# Altium footprint library DC_Motor.PcbLib: 32 footprints (part 2 of 2)
Each footprint in its own frame and in the unit in brackets; x right, y up, seen from the top. Pads: shape width x height; smd on the part's side, far side on the other; paste and mask are expansions set on the pad; w line width, h text height; cw(c..) or ccw(c..) is an arc to the next point about the centre after c.
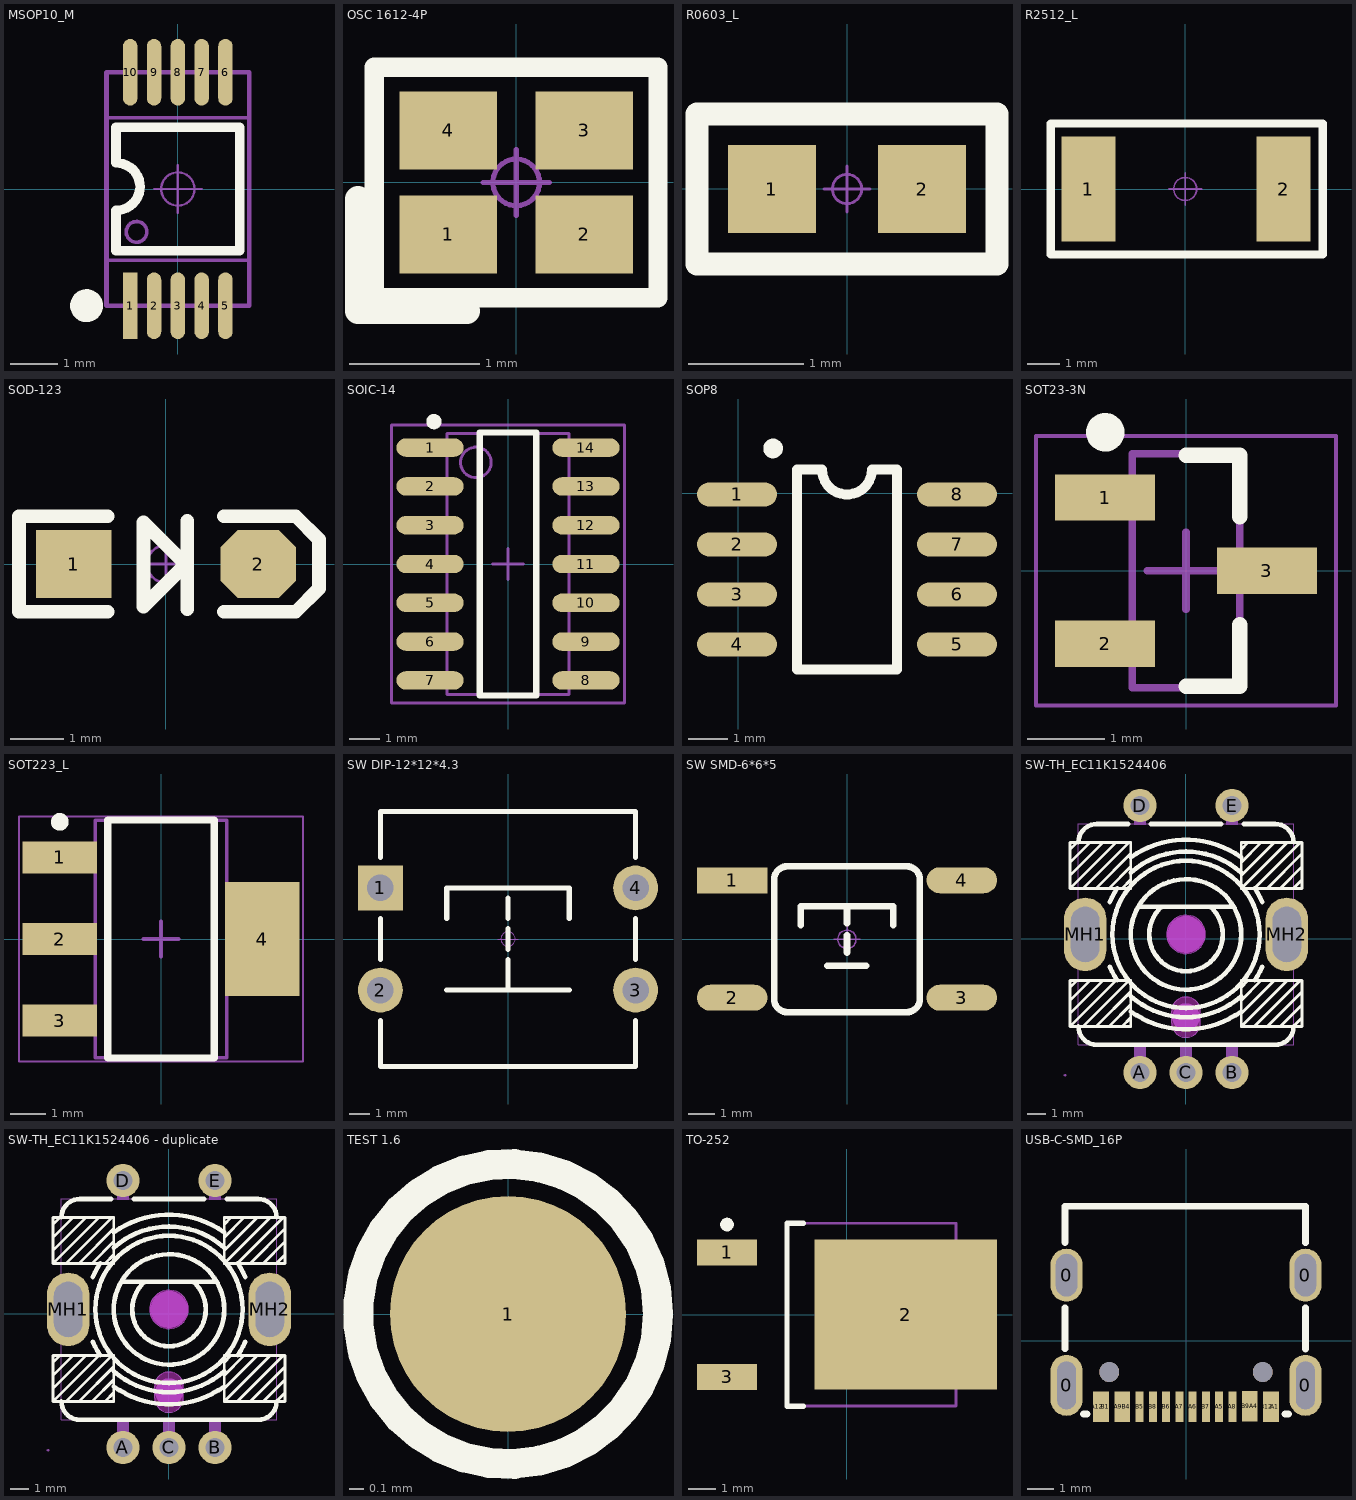
[diagram p1: the footprints below, top view; thin cyan lines are the x and y axes]

## MSOP10_M [mm] "塑封体长3mm，宽3mm，脚距0.5mm      淘宝ID:黄晶宝石"
height 0.5
pads (10):
  rect 0.305x1.4 smd: 1(-1,-2.45)
  oval 0.305x1.4 smd: 2(-0.5,-2.45) 3(0,-2.45) 4(0.5,-2.45) 5(1,-2.45) 6(1,2.45) 7(0.5,2.45) 8(0,2.45) 9(-0.5,2.45) 10(-1,2.45)
Top Overlay:
  circle w0.381: c-1.917,-2.45 r0.155
  lines w0.2: -1.3,-1.3 1.3,-1.3 1.3,1.3 -1.3,1.3
  lines w0.203: -1.3,-1.3 -1.3,-0.46 ; -1.3,-0.45 ccw(c-1.3,0.058) -0.792,0.058 ; -1.3,0.55 cw(c-1.3,0.042) -0.792,0.042 ; -1.3,0.556 -1.3,1.3
Mechanical 13:
  circle w0.076: c-0.867,-0.9 r0.217
  lines w0.076: -1.5,-1.5 -1.5,1.5 1.5,1.5 1.5,-1.5 -1.5,-1.5
Mechanical 15:
  circle w0.05: c0,0 r0.35
  lines w0.05: -0.5,0 0.5,0 ; 0,-0.5 0,0.5
  lines w0.1: -1.5,-2.45 1.5,-2.45 1.5,2.45 -1.5,2.45 -1.5,-2.45
3D body "MSOP-10.STEP": height 0.95, standoff 0, extent -1.5,-2.45 1.5,2.45

## OSC 1612-4P [mm] "1.6*1.2*0.35mm（长宽高）"
height 0.5
pads (4):
  rect 0.75x0.6 smd: 1(-0.525,-0.4) 2(0.525,-0.4) 3(0.525,0.4) 4(-0.525,0.4)
Top Overlay:
  lines w0.15: -1.092,-0.889 1.092,-0.889 1.092,0.889 -1.092,0.889 -1.092,-0.889
  lines w0.2: -1.219,-0.991 -0.381,-0.991 ; -1.219,-0.965 -1.219,-0.127
Mechanical 15:
  circle w0.04: c0,0 r0.18
  lines w0.04: -0.254,0 0.254,0 ; 0,-0.254 0,0.254
3D body "OSC_1612-4.STEP": height 0.35, standoff -0.02, extent -0.8,-0.6 0.8,0.6

## R0603_L [mil] "1/10W贴片电阻"
height 19.68
pads (2):
  rect 30x30 smd: 1(-25.59,0) 2(25.59,0)
Top Overlay:
  lines w8: -51.18,-25.59 51.18,-25.59 51.18,25.59 -51.18,25.59 -51.18,-25.59
Mechanical 15:
  circle w1: c0,0 r5
  lines w1: -7.87,0 7.87,0 ; 0,-7.87 0,7.87
3D body "R0603.STEP": height 15.79, standoff 0, extent -31.49,-15.74 31.5,15.75

## R2512_L [mm] "1W贴片电阻                淘宝ID:黄晶宝石"
height 0.5
pads (2):
  rect 1.65x3.2 smd: 1(-2.95,0) 2(3,0)
Top Overlay:
  lines w0.254: -4.1,-2 -4.1,2 4.2,2 4.2,-2 -4.1,-2
Mechanical 15:
  circle w0.05: c0,0 r0.35
  lines w0.05: -0.5,0 0.5,0 ; 0,-0.5 0,0.5
3D body "R2512.STEP": height 0.55, standoff 0, extent -3.2,-1.6 3.2,1.6

## SOD-123 [mil] "2.7x1.6X1.1mm（长宽高，不包括引脚） 淘宝ID:黄晶宝石"
height 19.68
pads (2):
  rect 55x50 smd: 1(-67.5,0)
  oct 55x50 smd: 2(67.5,0)
Top Overlay:
  lines w10: -42.5,-35 -107.5,-35 -107.5,35 -42.5,35 ; 14,-0.8 -16.4,-31.2 -16.4,30.5 15.6,-1.5 ; 15.6,-33.1 15.6,31.7 ; 42.5,-35 95,-35 112,-18 112,18 95,35 42.5,35
Mechanical 15:
  circle w1.97: c0,0 r13.78
  lines w1.97: -19.68,0 19.68,0 ; 0,-19.68 0,19.68
3D body "SOD-123.stp": height 50, standoff 1.97, extent -72.84,-31.5 72.83,31.49

## SOIC-14 [mm]
height 1.75
pads (14):
  oval 2.2x0.6 smd: 1(-2.552,3.81) 2(-2.552,2.54) 3(-2.552,1.27) 4(-2.552,0) 5(-2.552,-1.27) 6(-2.552,-2.54) 7(-2.552,-3.81) 8(2.552,-3.81) 9(2.552,-2.54) 10(2.552,-1.27) 11(2.552,0) 12(2.552,1.27) 13(2.552,2.54) 14(2.552,3.81)
Top Overlay:
  circle w0.25: c-2.425,4.66 r0.125
  lines w0.2: -0.925,-4.3 -0.925,4.3 0.925,4.3 0.925,-4.3 -0.925,-4.3
Mechanical 13:
  circle w0.1: c-1.05,3.325 r0.5
  lines w0.1: -2,-4.275 -2,4.275 2,4.275 2,-4.275 -2,-4.275
Mechanical 15:
  lines w0.1: -0.5,0 0.5,0 ; 0,-0.5 0,0.5 ; -3.81,-4.55 -3.81,4.55 3.81,4.55 3.81,-4.55 -3.81,-4.55
3D body "SOP-14.STEP": height 1.9, standoff 0, extent -3.003,-4.35 3.003,4.35

## SOP8 [mil]
height 19.68
pads (8):
  oval 80x24 smd: 1(-1,-1) 2(-1,-51) 3(-1,-101) 4(-1,-151) 5(219,-151) 6(219,-101) 7(219,-51) 8(219,-1)
Top Overlay:
  circle w9.84: c35.08,45 r4.92
  lines w10: 59,-176 159,-176 159,24 134,24 cw(c109,24) 84,24 59,24 59,-176
3D body "SOP8.STEP": height 74.8, standoff 0.03, extent -11.92,-173.23 224.52,23.62

## SOT23-3N [mm] "SOT23, 3-Leads, Body 2.9x1.3mm, Pitch 0.95mm, Lead Span 2.4mm, IPC Medium Density"
height 1.12
pads (3):
  rect 1.3x0.6 smd: 1(-1.05,0.95) 2(-1.05,-0.95) 3(1.05,0)
Top Overlay:
  circle w0.25: c-1.05,1.8 r0.125
  lines w0.2: 0,-1.5 0.7,-1.5 0.7,-0.7 ; 0,1.5 0.7,1.5 0.7,0.7
Mechanical 13:
  lines w0.1: -0.7,-1.52 0.7,-1.52 0.7,1.52 -0.7,1.52 -0.7,-1.52
Mechanical 15:
  lines w0.05: -1.95,-1.75 1.95,-1.75 1.95,1.75 -1.95,1.75 -1.95,-1.75
  lines w0.1: -0.5,0 0.5,0 ; 0,-0.5 0,0.5
3D body "SOT23-3-2.STEP": height 1.05, standoff 0, extent -1.2,-1.5 1.2,1.5

## SOT223_L [mm] "SOT223, 4-Leads, Body 6.5x3.5mm, Pitch 2.3mm, Lead Span 7mm, IPC High Density"
height 1.8
pads (4):
  rect 2.1x0.9 smd: 1(-2.85,2.3) 2(-2.85,0) 3(-2.85,-2.3)
  rect 2.1x3.2 smd: 4(2.85,0)
Top Overlay:
  circle w0.25: c-2.85,3.3 r0.125
  lines w0.2: -1.5,-3.35 -1.5,3.35 1.5,3.35 1.5,-3.35 -1.5,-3.35
Mechanical 13:
  lines w0.1: -1.855,-3.35 -1.855,3.35 1.855,3.35 1.855,-3.35 -1.855,-3.35
Mechanical 15:
  lines w0.05: -4,-3.45 -4,3.45 4,3.45 4,-3.45 -4,-3.45
  lines w0.1: -0.5,0 0.5,0 ; 0,-0.5 0,0.5
3D body "SOT223.STEP": height 1.65, standoff -0.02, extent -3.508,-3.25 3.508,3.25

## SW DIP-12*12*4.3 [mm] "12*12*4.3mm                                 淘宝ID:黄晶宝石"
height 0.5
pads (4):
  rect 2.2x2.2 hole 1.3: 1(-6.25,2.5)
  round 2.2 hole 1.3: 2(-6.25,-2.5) 3(6.25,-2.5) 4(6.25,2.5)
Top Overlay:
  lines w0.254: -6.25,-4 -6.25,-6.25 6.25,-6.25 6.25,-4 ; -6.25,-1 -6.25,1 ; -6.25,4 -6.25,6.25 6.25,6.25 6.25,4 ; -3,-2.5 3,-2.5 ; -3,1 -3,2.5 3,2.5 3,1 ; 0,-2.5 0,-1 ; 0,-0.5 0,0.5 ; 0,1 0,2 ; 6.25,-1 6.25,1
Bottom Overlay:
  lines w0.254: -4.826,-2.54 4.826,-2.54 ; -4.826,2.54 4.826,2.54
Mechanical 15:
  circle w0.05: c0,0 r0.35
  lines w0.05: -0.5,0 0.5,0 ; 0,-0.5 0,0.5
3D body "TSW_DIP-12x12x4.3.STEP": height 4.45, standoff -3.35, extent -6.898,-6 6.898,6

## SW SMD-6*6*5 [mm] "6*6*5mm                                 淘宝ID:黄晶宝石"
height 0.5
pads (4):
  rect 2.7x1 smd: 1(-4.4,2.261)
  oval 2.7x1 smd: 2(-4.4,-2.239) 3(4.4,-2.239) 4(4.4,2.261)
Top Overlay:
  lines w0.254: -1.778,0.533 -1.778,1.27 1.778,1.27 1.778,0.533 ; -0.762,-1.016 0.737,-1.016 ; 0,-0.508 0,0.152 ; 0,0.61 0,1.27 ; -2.794,-2.286 ccw(c-2.286,-2.286) -2.286,-2.794 2.286,-2.794 ccw(c2.286,-2.286) 2.794,-2.286 2.794,2.286 ccw(c2.286,2.286) 2.286,2.794 -2.286,2.794 ccw(c-2.286,2.286) -2.794,2.286 -2.794,-2.286
Mechanical 15:
  circle w0.05: c0,0 r0.35
  lines w0.05: -0.5,0 0.5,0 ; 0,-0.5 0,0.5
3D body "TSW_SMD-6x6x5.STEP": height 5.03, standoff 0.05, extent -4.5,-3 4.5,3

## SW-TH_EC11K1524406 [mm]
height 0.5
pads (7):
  round 1.8 hole 1.05 mask+0.051: A(-2.5,-7.25) B(2.5,-7.25) C(0,-7.25) D(-2.5,7.25) E(2.5,7.25)
  oval 2.3x4 hole 1.55 slot 3 at 90 deg copper offset 0,0 mask+0.051: MH1(-5.475,0.25)
  oval 2.3x4 hole 1.55 slot 3 at 90 deg mask+0.051: MH2(5.475,0.25)
Top Overlay:
  circle w0.254: c0,0.25 r3
  lines w0.15: -6.3,-4.043 -4.507,-2.25 ; -6.3,-3.336 -5.214,-2.25 ; -6.3,-2.629 -5.921,-2.25 ; -6.3,3.457 -4.507,5.25 ; -6.3,4.164 -5.214,5.25 ; -6.3,4.871 -5.921,5.25 ; -5.593,-4.75 -3.093,-2.25 ; -5.593,2.75 -3.093,5.25 ; -4.886,-4.75 -3,-2.864 ; -4.886,2.75 -3,4.636 ; -4.179,-4.75 -3,-3.571 ; -4.179,2.75 -3,3.929 ; -3.8,-2.25 -6.3,-4.75 ; -3.8,5.25 -6.3,2.75 ; -3.472,-4.75 -3,-4.278 ; -3.472,2.75 -3,3.222 ; 3,-4.043 4.793,-2.25 ; 3,-3.336 4.086,-2.25 ; 3,-2.629 3.379,-2.25 ; 3,3.457 4.793,5.25 ; 3,4.164 4.086,5.25 ; 3,4.871 3.379,5.25 ; 3.707,-4.75 6.207,-2.25 ; 3.707,2.75 6.207,5.25 ; 4.414,-4.75 6.3,-2.864 ; 4.414,2.75 6.3,4.636 ; 5.121,-4.75 6.3,-3.571 ; 5.121,2.75 6.3,3.929 ; 5.5,-2.25 3,-4.75 ; 5.5,5.25 3,2.75 ; 5.828,-4.75 6.3,-4.278 ; 5.828,2.75 6.3,3.222 ; -6.3,-4.75 -6.3,-2.25 -3,-2.25 -3,-4.75 -6.3,-4.75 ; -6.3,2.75 -6.3,5.25 -3,5.25 -3,2.75 -6.3,2.75 ; 3,-4.75 3,-2.25 6.3,-2.25 6.3,-4.75 3,-4.75 ; 3,2.75 3,5.25 6.3,5.25 6.3,2.75 3,2.75
  lines w0.254: -5.849,-4.75 ccw(c-4.841,-4.74) -4.841,-5.748 4.842,-5.748 ccw(c4.842,-4.74) 5.851,-4.75 ; -5.849,5.25 cw(c-4.84,5.242) -4.841,6.251 -3.141,6.251 ; -4.143,-1.506 ccw(c0,0.25) -3.742,-2.25 ; -4.143,2.006 cw(c0,0.25) -3.742,2.75 ; -3.123,-2.25 cw(c0,0.25) -3.123,2.75 ; -3,-3.936 ccw(c0,0.25) 3,-3.936 ; -3,-3.104 ccw(c0,0.25) 3,-3.104 ; -3,-2.396 ccw(c0,0.25) 3,-2.396 ; -3,2.896 cw(c0,0.25) 3,2.896 ; -3,3.604 cw(c0,0.25) 3,3.604 ; -3,4.436 cw(c0,0.25) 3,4.436 ; -2.598,1.751 2.597,1.751 ; -1.9,6.251 1.9,6.251 ; -1.322,1.751 ccw(c0,0.25) 1.321,1.751 ; 3.122,-2.25 ccw(c0,0.25) 3.122,2.75 ; 3.142,6.25 4.842,6.25 cw(c4.842,5.242) 5.851,5.25 ; 3.742,-2.25 ccw(c0,0.25) 4.143,-1.506 ; 3.742,2.75 cw(c0,0.25) 4.143,2.006
Keep-Out Layer:
  board cut-out: 1.05,0.25 1.05,0.388 0.978,0.655 0.84,0.895 0.645,1.09 0.405,1.228 0.138,1.3 -0.138,1.3 -0.405,1.228 -0.645,1.09 -0.84,0.895 -0.978,0.655 -1.05,0.388 -1.05,0.25 -1.05,0.112 -0.978,-0.155 -0.84,-0.395 -0.645,-0.59 -0.405,-0.729 -0.138,-0.8 0.138,-0.8 0.405,-0.729 0.645,-0.59 0.84,-0.395 0.978,-0.155 1.05,0.112 1.05,0.25
  board cut-out: 0.775,-4.575 0.775,-4.677 0.722,-4.874 0.62,-5.051 0.476,-5.195 0.299,-5.297 0.102,-5.35 -0.102,-5.35 -0.299,-5.297 -0.476,-5.195 -0.62,-5.051 -0.722,-4.874 -0.775,-4.677 -0.775,-4.575 -0.775,-3.925 -0.775,-3.823 -0.722,-3.626 -0.62,-3.449 -0.476,-3.305 -0.299,-3.203 -0.102,-3.15 0.102,-3.15 0.299,-3.203 0.476,-3.305 0.62,-3.449 0.722,-3.626 0.775,-3.823 0.775,-3.925
Mechanical 1:
  circle w0.005: c0,0.25 r1.05
  lines w0.005: -0.775,-4.575 ccw(c0,-4.575) 0.775,-4.575 0.775,-3.925 ccw(c0,-3.925) -0.775,-3.925 -0.775,-4.575
Mechanical 6:
  circle w1: c0,0.25 r0.5
  circle w0.75: c0,-4.25 r0.375
Mechanical 15:
  region: -6.51,-7.4 -6.51,-7.375 -6.545,-7.34 -6.595,-7.34 -6.63,-7.375 -6.63,-7.4 -6.63,-7.425 -6.595,-7.46 -6.545,-7.46 -6.51,-7.425 -6.51,-7.4
  region: -2.8,-7.1 -2.2,-7.1 -2.2,-7.4 -2.8,-7.4
  region: -0.3,-7.1 0.3,-7.1 0.3,-7.4 -0.3,-7.4
  region: 2.2,-7.1 2.8,-7.1 2.8,-7.4 2.2,-7.4
  region: 5.625,1.5 5.625,-1 5.325,-1 5.325,1.5
  region: -5.325,1.5 -5.325,-1 -5.625,-1 -5.625,1.5
  region: 2.2,7.4 2.8,7.4 2.8,7.1 2.2,7.1
  region: -2.8,7.4 -2.2,7.4 -2.2,7.1 -2.8,7.1
  region: 5.325,1.5 6.57,1.5 6.57,-1 5.325,-1
  region: -5.325,-1 -6.57,-1 -6.57,1.5 -5.325,1.5
  region: 2.2,7.4 2.8,7.4 2.8,6.2 2.2,6.2
  region: -2.8,7.4 -2.2,7.4 -2.2,6.2 -2.8,6.2
  region: 2.8,-7.4 2.8,-5.71 2.21,-5.71 2.2,-5.71 2.2,-7.4
  region: 0.3,-7.4 0.3,-5.71 -0.29,-5.71 -0.3,-5.71 -0.3,-7.4
  region: -2.2,-7.4 -2.2,-5.71 -2.79,-5.71 -2.8,-5.71 -2.8,-7.4
  lines w0.051: -5.85,-5.75 5.85,-5.75 5.85,6.25 -5.85,6.25 -5.85,-5.75
3D body "User Library-EC11B15244.STEP": height 31.6, standoff -3.47, extent -6.549,-7.632 6.549,7.493

## SW-TH_EC11K1524406 - duplicate [mm]
pads (7):
  round 1.8 hole 1.05 mask+0.051: A(-2.5,-7.25) B(2.5,-7.25) C(0,-7.25) D(-2.5,7.25) E(2.5,7.25)
  oval 2.3x4 hole 1.55 slot 3 at 90 deg copper offset 0,0 mask+0.051: MH1(-5.475,0.25)
  oval 2.3x4 hole 1.55 slot 3 at 90 deg mask+0.051: MH2(5.475,0.25)
Top Overlay:
  circle w0.254: c0,0.25 r3
  lines w0.15: -6.3,-4.043 -4.507,-2.25 ; -6.3,-3.336 -5.214,-2.25 ; -6.3,-2.629 -5.921,-2.25 ; -6.3,3.457 -4.507,5.25 ; -6.3,4.164 -5.214,5.25 ; -6.3,4.871 -5.921,5.25 ; -5.593,-4.75 -3.093,-2.25 ; -5.593,2.75 -3.093,5.25 ; -4.886,-4.75 -3,-2.864 ; -4.886,2.75 -3,4.636 ; -4.179,-4.75 -3,-3.571 ; -4.179,2.75 -3,3.929 ; -3.8,-2.25 -6.3,-4.75 ; -3.8,5.25 -6.3,2.75 ; -3.472,-4.75 -3,-4.278 ; -3.472,2.75 -3,3.222 ; 3,-4.043 4.793,-2.25 ; 3,-3.336 4.086,-2.25 ; 3,-2.629 3.379,-2.25 ; 3,3.457 4.793,5.25 ; 3,4.164 4.086,5.25 ; 3,4.871 3.379,5.25 ; 3.707,-4.75 6.207,-2.25 ; 3.707,2.75 6.207,5.25 ; 4.414,-4.75 6.3,-2.864 ; 4.414,2.75 6.3,4.636 ; 5.121,-4.75 6.3,-3.571 ; 5.121,2.75 6.3,3.929 ; 5.5,-2.25 3,-4.75 ; 5.5,5.25 3,2.75 ; 5.828,-4.75 6.3,-4.278 ; 5.828,2.75 6.3,3.222 ; -6.3,-4.75 -6.3,-2.25 -3,-2.25 -3,-4.75 -6.3,-4.75 ; -6.3,2.75 -6.3,5.25 -3,5.25 -3,2.75 -6.3,2.75 ; 3,-4.75 3,-2.25 6.3,-2.25 6.3,-4.75 3,-4.75 ; 3,2.75 3,5.25 6.3,5.25 6.3,2.75 3,2.75
  lines w0.254: -5.849,-4.75 ccw(c-4.841,-4.74) -4.841,-5.748 4.842,-5.748 ccw(c4.842,-4.74) 5.851,-4.75 ; -5.849,5.25 cw(c-4.84,5.242) -4.841,6.251 -3.141,6.251 ; -4.143,-1.506 ccw(c0,0.25) -3.742,-2.25 ; -4.143,2.006 cw(c0,0.25) -3.742,2.75 ; -3.123,-2.25 cw(c0,0.25) -3.123,2.75 ; -3,-3.936 ccw(c0,0.25) 3,-3.936 ; -3,-3.104 ccw(c0,0.25) 3,-3.104 ; -3,-2.396 ccw(c0,0.25) 3,-2.396 ; -3,2.896 cw(c0,0.25) 3,2.896 ; -3,3.604 cw(c0,0.25) 3,3.604 ; -3,4.436 cw(c0,0.25) 3,4.436 ; -2.598,1.751 2.597,1.751 ; -1.9,6.251 1.9,6.251 ; -1.322,1.751 ccw(c0,0.25) 1.321,1.751 ; 3.122,-2.25 ccw(c0,0.25) 3.122,2.75 ; 3.142,6.25 4.842,6.25 cw(c4.842,5.242) 5.851,5.25 ; 3.742,-2.25 ccw(c0,0.25) 4.143,-1.506 ; 3.742,2.75 cw(c0,0.25) 4.143,2.006
Keep-Out Layer:
  board cut-out: 1.05,0.25 1.05,0.388 0.978,0.655 0.84,0.895 0.645,1.09 0.405,1.228 0.138,1.3 -0.138,1.3 -0.405,1.228 -0.645,1.09 -0.84,0.895 -0.978,0.655 -1.05,0.388 -1.05,0.25 -1.05,0.112 -0.978,-0.155 -0.84,-0.395 -0.645,-0.59 -0.405,-0.729 -0.138,-0.8 0.138,-0.8 0.405,-0.729 0.645,-0.59 0.84,-0.395 0.978,-0.155 1.05,0.112 1.05,0.25
  board cut-out: 0.775,-4.575 0.775,-4.677 0.722,-4.874 0.62,-5.051 0.476,-5.195 0.299,-5.297 0.102,-5.35 -0.102,-5.35 -0.299,-5.297 -0.476,-5.195 -0.62,-5.051 -0.722,-4.874 -0.775,-4.677 -0.775,-4.575 -0.775,-3.925 -0.775,-3.823 -0.722,-3.626 -0.62,-3.449 -0.476,-3.305 -0.299,-3.203 -0.102,-3.15 0.102,-3.15 0.299,-3.203 0.476,-3.305 0.62,-3.449 0.722,-3.626 0.775,-3.823 0.775,-3.925
Mechanical 1:
  circle w0.005: c0,0.25 r1.05
  lines w0.005: -0.775,-4.575 ccw(c0,-4.575) 0.775,-4.575 0.775,-3.925 ccw(c0,-3.925) -0.775,-3.925 -0.775,-4.575
Mechanical 6:
  circle w1: c0,0.25 r0.5
  circle w0.75: c0,-4.25 r0.375
Mechanical 15:
  region: -6.51,-7.4 -6.51,-7.375 -6.545,-7.34 -6.595,-7.34 -6.63,-7.375 -6.63,-7.4 -6.63,-7.425 -6.595,-7.46 -6.545,-7.46 -6.51,-7.425 -6.51,-7.4
  region: -2.8,-7.1 -2.2,-7.1 -2.2,-7.4 -2.8,-7.4
  region: -0.3,-7.1 0.3,-7.1 0.3,-7.4 -0.3,-7.4
  region: 2.2,-7.1 2.8,-7.1 2.8,-7.4 2.2,-7.4
  region: 5.625,1.5 5.625,-1 5.325,-1 5.325,1.5
  region: -5.325,1.5 -5.325,-1 -5.625,-1 -5.625,1.5
  region: 2.2,7.4 2.8,7.4 2.8,7.1 2.2,7.1
  region: -2.8,7.4 -2.2,7.4 -2.2,7.1 -2.8,7.1
  region: 5.325,1.5 6.57,1.5 6.57,-1 5.325,-1
  region: -5.325,-1 -6.57,-1 -6.57,1.5 -5.325,1.5
  region: 2.2,7.4 2.8,7.4 2.8,6.2 2.2,6.2
  region: -2.8,7.4 -2.2,7.4 -2.2,6.2 -2.8,6.2
  region: 2.8,-7.4 2.8,-5.71 2.21,-5.71 2.2,-5.71 2.2,-7.4
  region: 0.3,-7.4 0.3,-5.71 -0.29,-5.71 -0.3,-5.71 -0.3,-7.4
  region: -2.2,-7.4 -2.2,-5.71 -2.79,-5.71 -2.8,-5.71 -2.8,-7.4
  lines w0.051: -5.85,-5.75 5.85,-5.75 5.85,6.25 -5.85,6.25 -5.85,-5.75

## TEST 1.6 [mm] "测试点1.6mm"
height 0.5
pads (1):
  round 1.6 smd paste-1.6: 1(0,0)
Top Overlay:
  circle w0.203: c0,0 r1.016

## TO-252 [mm]
height 0.5
pads (3):
  rect 2.2x0.95 smd: 1(-4.4,2.28) 3(-4.4,-2.28)
  rect 6.7x5.5 smd: 2(2.15,0)
Top Overlay:
  circle w0.25: c-4.4,3.305 r0.125
  lines w0.2: -1.6,-3.35 -2.2,-3.35 -2.2,3.35 -1.6,3.35
Mechanical 13:
  lines w0.1: -2.2,-3.35 4,-3.35 4,3.35 -2.2,3.35 -2.2,-3.35
Mechanical 15:
  lines w0.1: -0.5,0 0.5,0 ; 0,-0.5 0,0.5
3D body "DPAK_TO-252AA.STEP": height 2.5, standoff 0.1, extent -5.082,-3.367 5.018,3.367

## USB-C-SMD_16P [mm] "封装库来自淘宝ID:黄晶宝石"
height 0.5
pads (22):
  oval 1.2x2.3 hole 0.7 slot 1.8 at 90 deg: 0(-4.5,-1.675) 0(4.5,-1.675)
  oval 1.2x2 hole 0.8 slot 1.6 at 90 deg: 0(-4.5,2.475) 0(4.5,2.475)
  rect 0.3x1.15 smd: A1(3.35,-2.473) A4(2.55,-2.471) A5(1.25,-2.475) A6(0.25,-2.475) A7(-0.25,-2.473) A9(-2.55,-2.475) A12(-3.35,-2.475) B1(-3.05,-2.475) B4(-2.25,-2.475) B5(-1.75,-2.475) B6(-0.75,-2.475) B7(0.75,-2.473) B9(2.25,-2.471) B12(3.05,-2.473)
  rect 0.3x1.148 smd: A8(1.75,-2.475) B8(-1.25,-2.475)
  round 0.75 hole 0.75 unplated: ""(-2.89,-1.175) ""(2.89,-1.175)
Top Overlay:
  lines w0.254: -4.557,-0.296 -4.557,1.246 ; -4.557,3.704 -4.557,5.075 4.5,5.075 4.5,3.698 ; -3.856,-2.75 -3.819,-2.75 -3.731,-2.75 ; 3.731,-2.75 3.856,-2.75 ; 4.5,-0.302 4.5,1.252
3D body "USB_TYPE-C_a.STEP": height 3.25, standoff -0.85, extent -4.445,-2.875 4.495,5.025